# Altium footprint library 常用原件库.PcbLib: 163 footprints (part 4 of 11)
Each footprint in its own frame and in the unit in brackets; x right, y up, seen from the top. Pads: shape width x height; smd on the part's side, far side on the other; paste and mask are expansions set on the pad; w line width, h text height; cw(c..) or ccw(c..) is an arc to the next point about the centre after c.
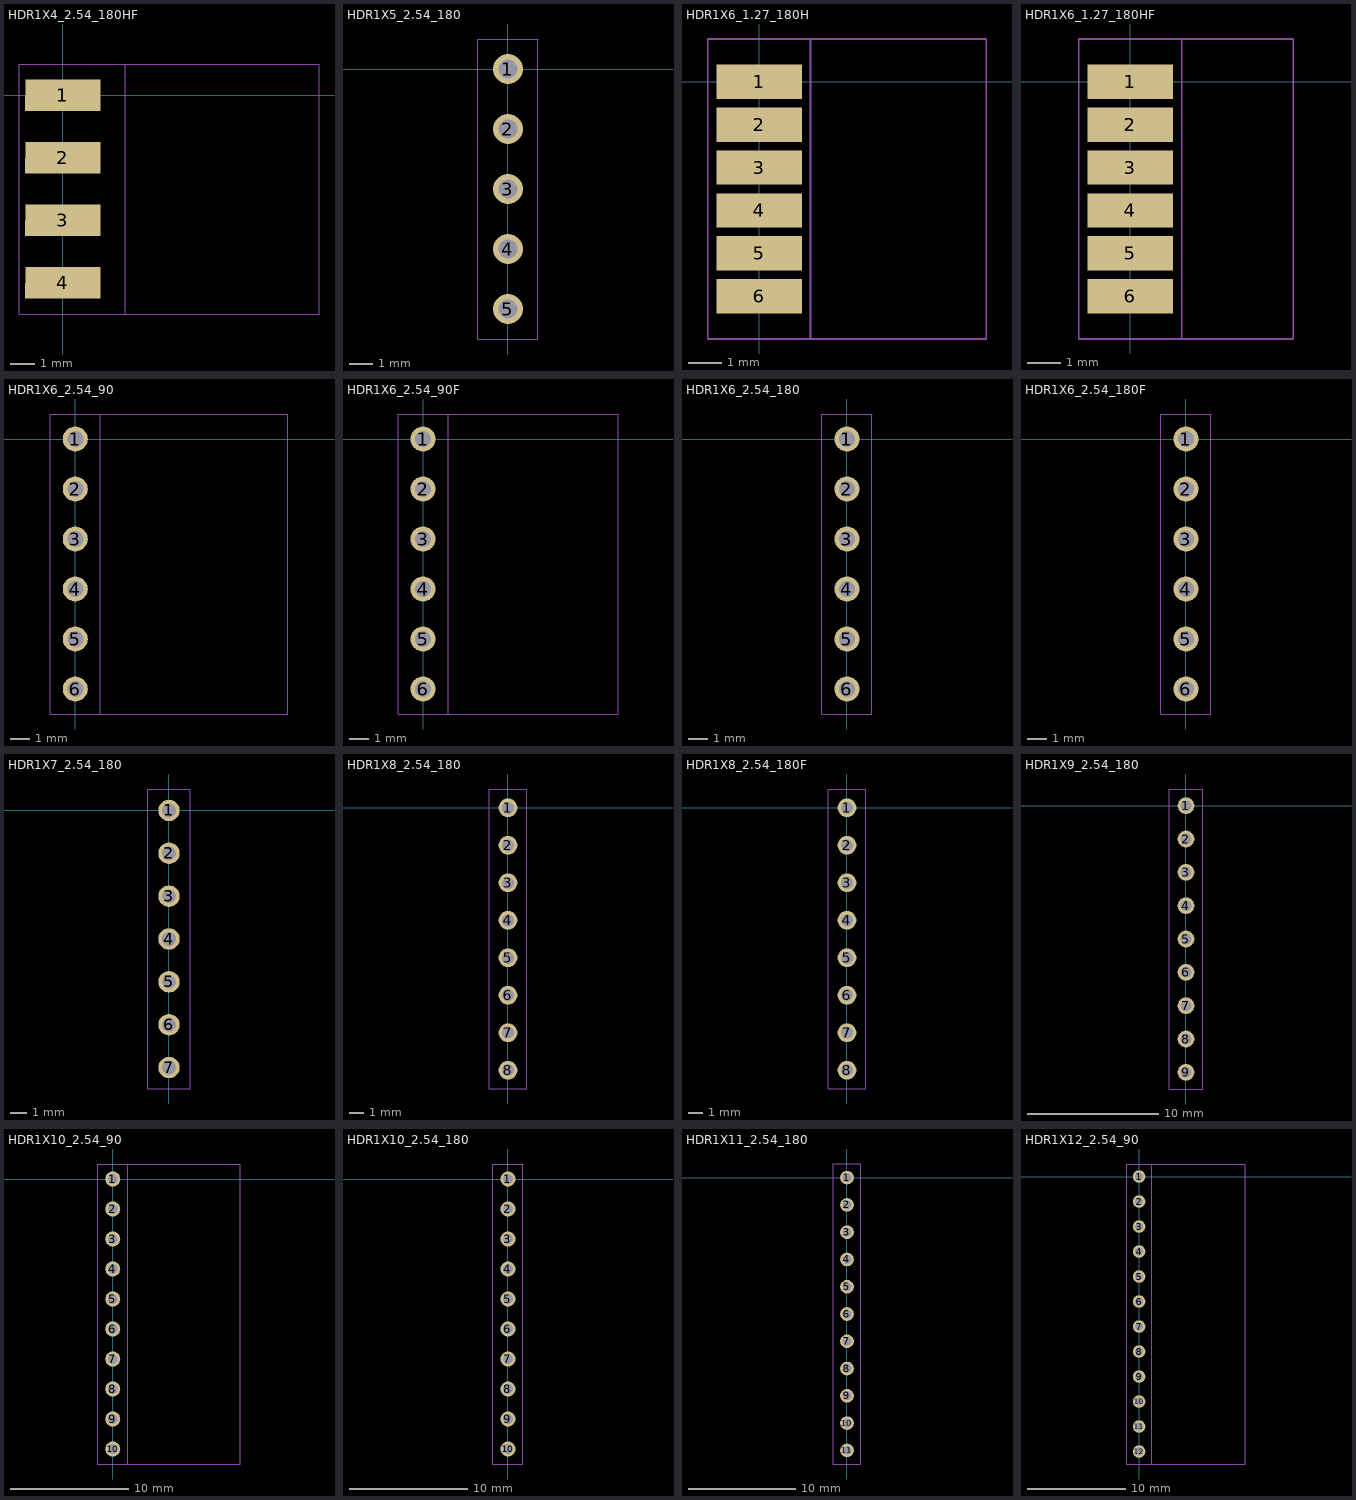
[diagram p3: the footprints below, top view; thin cyan lines are the x and y axes]

## HDR1X4_2.54_180HF [mil]
height 169.29
pads (4):
  rect 120x50 smd: 1(0,0) 2(0,-100) 3(0,-200) 4(0,-300)
Mechanical 13:
  lines w2: -70,-350 410,-350 410,50 -70,50 -70,-350
Mechanical 14:
  lines w2: -70,-350 -70,50 100,50 100,-350 -70,-350

## HDR1X5_2.54_180 [mil]
height 169.29
pads (5):
  round 50 hole 32: 1(0,0) 2(0,-100) 3(0,-200) 4(0,-300) 5(0,-400)
Mechanical 13:
  lines w2: -50,-450 50,-450 50,50 -50,50 -50,-450
Mechanical 14:
  lines w2: -50,-450 -50,50 50,50 50,-450 -50,-450
3D body: height 322.83, standoff -118.11, extent -49.18,-450 49.18,50

## HDR1X6_1.27_180H [mil]
height 169.29
pads (6):
  rect 100x40 smd: 1(0,0) 2(0,-50) 3(0,-100) 4(0,-150) 5(0,-200) 6(0,-250)
Mechanical 13:
  lines w2: -60,-300 -60,50 265,50 265,-300 -60,-300
Mechanical 14:
  lines w2: -60,-300 60,-300 60,50 -60,50 -60,-300
3D body: height 49.21, standoff -49.21, extent -47.36,-274.99 265.24,25.01

## HDR1X6_1.27_180HF [mil]
height 169.29
pads (6):
  rect 100x40 smd: 1(0,0) 2(0,-50) 3(0,-100) 4(0,-150) 5(0,-200) 6(0,-250)
Mechanical 13:
  lines w2: -60,-300 190,-300 190,50 -60,50 -60,-300
Mechanical 14:
  lines w2: -60,-300 -60,50 60,50 60,-300 -60,-300
3D body: height 35.43, standoff -35.43, extent -38.35,-282.88 190,32.88

## HDR1X6_2.54_90 [mil]
height 169.29
pads (6):
  round 50 hole 32: 1(0,0) 2(0,-100) 3(0,-200) 4(0,-300) 5(0,-400) 6(0,-500)
Mechanical 13:
  lines w2: -50,-550 425,-550 425,50 -50,50 -50,-550
Mechanical 14:
  lines w2: -50,-550 50,-550 50,50 -50,50 -50,-550
3D body: height 99.21, standoff -93.7, extent -14.96,-546.06 423.62,46.07

## HDR1X6_2.54_90F [mil]
height 169.29
pads (6):
  round 50 hole 32: 1(0,0) 2(0,-100) 3(0,-200) 4(0,-300) 5(0,-400) 6(0,-500)
Mechanical 13:
  lines w2: -50,-550 390,-550 390,50 -50,50 -50,-550
Mechanical 14:
  lines w2: -50,-550 -50,50 50,50 50,-550 -50,-550
3D body: height 99.21, standoff -125.2, extent -10,-554.92 386.06,54.92

## HDR1X6_2.54_180 [mil]
height 169.29
pads (6):
  round 50 hole 32: 1(0,0) 2(0,-100) 3(0,-200) 4(0,-300) 5(0,-400) 6(0,-500)
Mechanical 13:
  lines w2: -50,-550 -50,50 50,50 50,-550 -50,-550
Mechanical 14:
  lines w2: -50,-550 -50,50 50,50 50,-550 -50,-550
3D body: height 322.83, standoff -118.11, extent -49.18,-550 49.18,50

## HDR1X6_2.54_180F [mil]
height 169.29
pads (6):
  round 50 hole 32: 1(0,0) 2(0,-100) 3(0,-200) 4(0,-300) 5(0,-400) 6(0,-500)
Mechanical 13:
  lines w2: -50,-550 50,-550 50,50 -50,50 -50,-550
Mechanical 14:
  lines w2: -50,-550 -50,50 50,50 50,-550 -50,-550
3D body: height 334.65, standoff -125.98, extent -49.21,-554.84 49.21,55

## HDR1X7_2.54_180 [mil]
height 169.29
pads (7):
  round 50 hole 32: 1(0,0) 2(0,-100) 3(0,-200) 4(0,-300) 5(0,-400) 6(0,-500) 7(0,-600)
Mechanical 13:
  lines w2: -50,-650 50,-650 50,50 -50,50 -50,-650
Mechanical 14:
  lines w2: -50,-650 50,-650 50,50 -50,50 -50,-650
3D body: height 322.83, standoff -118.11, extent -49.18,-650 49.18,50

## HDR1X8_2.54_180 [mil]
height 169.29
pads (8):
  round 50 hole 32: 1(0,0) 2(0,-100) 3(0,-200) 4(0,-300) 5(0,-400) 6(0,-500) 7(0,-600) 8(0,-700)
Mechanical 13:
  lines w2: -50,-750 50,-750 50,50 -50,50 -50,-750
Mechanical 14:
  lines w2: -50,-750 -50,50 50,50 50,-750 -50,-750
3D body: height 322.83, standoff -118.11, extent -49.18,-750 49.18,49.99

## HDR1X8_2.54_180F [mil]
height 169.29
pads (8):
  round 50 hole 32: 1(0,0) 2(0,-100) 3(0,-200) 4(0,-300) 5(0,-400) 6(0,-500) 7(0,-600) 8(0,-700)
Mechanical 13:
  lines w2: -50,-750 50,-750 50,50 -50,50 -50,-750
Mechanical 14:
  lines w2: -50,-750 50,-750 50,50 -50,50 -50,-750
3D body: height 334.65, standoff -125.98, extent -49.21,-754.84 49.21,55

## HDR1X9_2.54_180 [mil]
height 169.29
pads (9):
  round 50 hole 32: 1(0,0) 2(0,-100) 3(0,-200) 4(0,-300) 5(0,-400) 6(0,-500) 7(0,-600) 8(0,-700) 9(0,-800)
Mechanical 13:
  lines w2: -50,-850 50,-850 50,50 -50,50 -50,-850
Mechanical 14:
  lines w2: -50,-850 -50,50 50,50 50,-850 -50,-850
3D body: height 322.83, standoff -118.11, extent -49.18,-849.99 49.18,50

## HDR1X10_2.54_90 [mil]
height 169.29
pads (10):
  round 50 hole 32: 1(0,0) 2(0,-100) 3(0,-200) 4(0,-300) 5(0,-400) 6(0,-500) 7(0,-600) 8(0,-700) 9(0,-800) 10(0,-900)
Mechanical 13:
  lines w2: -50,-950 425,-950 425,50 -50,50 -50,-950
Mechanical 14:
  lines w2: -50,-950 50,-950 50,50 -50,50 -50,-950
3D body: height 99.21, standoff -93.7, extent -15,-946.06 423.58,46.06

## HDR1X10_2.54_180 [mil]
height 169.29
pads (10):
  round 50 hole 32: 1(0,0) 2(0,-100) 3(0,-200) 4(0,-300) 5(0,-400) 6(0,-500) 7(0,-600) 8(0,-700) 9(0,-800) 10(0,-900)
Mechanical 13:
  lines w2: -50,-950 50,-950 50,50 -50,50 -50,-950
Mechanical 14:
  lines w2: -50,-950 -50,50 50,50 50,-950 -50,-950
3D body: height 322.83, standoff -118.11, extent -49.18,-950 49.18,50

## HDR1X11_2.54_180 [mil]
height 169.29
pads (11):
  round 50 hole 32: 1(0,0) 2(0,-100) 3(0,-200) 4(0,-300) 5(0,-400) 6(0,-500) 7(0,-600) 8(0,-700) 9(0,-800) 10(0,-900) 11(0,-1000)
Mechanical 13:
  lines w2: -50,-1050 -50,50 50,50 50,-1050 -50,-1050
Mechanical 14:
  lines w2: -50,-1050 -50,50 50,50 50,-1050 -50,-1050
3D body: height 322.83, standoff -118.11, extent -49.18,-1050 49.18,50

## HDR1X12_2.54_90 [mil]
height 169.29
pads (12):
  round 50 hole 32: 1(0,0) 2(0,-100) 3(0,-200) 4(0,-300) 5(0,-400) 6(0,-500) 7(0,-600) 8(0,-700) 9(0,-800) 10(0,-900) 11(0,-1000) 12(0,-1100)
Mechanical 13:
  lines w2: -50,-1150 -50,50 425,50 425,-1150 -50,-1150
Mechanical 14:
  lines w2: -50,-1150 -50,50 50,50 50,-1150 -50,-1150
3D body: height 99.21, standoff -93.7, extent -15,-1146.06 423.58,46.06